# Altium footprint library En.PcbLib: 157 footprints (part 3 of 10)
Each footprint in its own frame and in the unit in brackets; x right, y up, seen from the top. Pads: shape width x height; smd on the part's side, far side on the other; paste and mask are expansions set on the pad; w line width, h text height; cw(c..) or ccw(c..) is an arc to the next point about the centre after c.
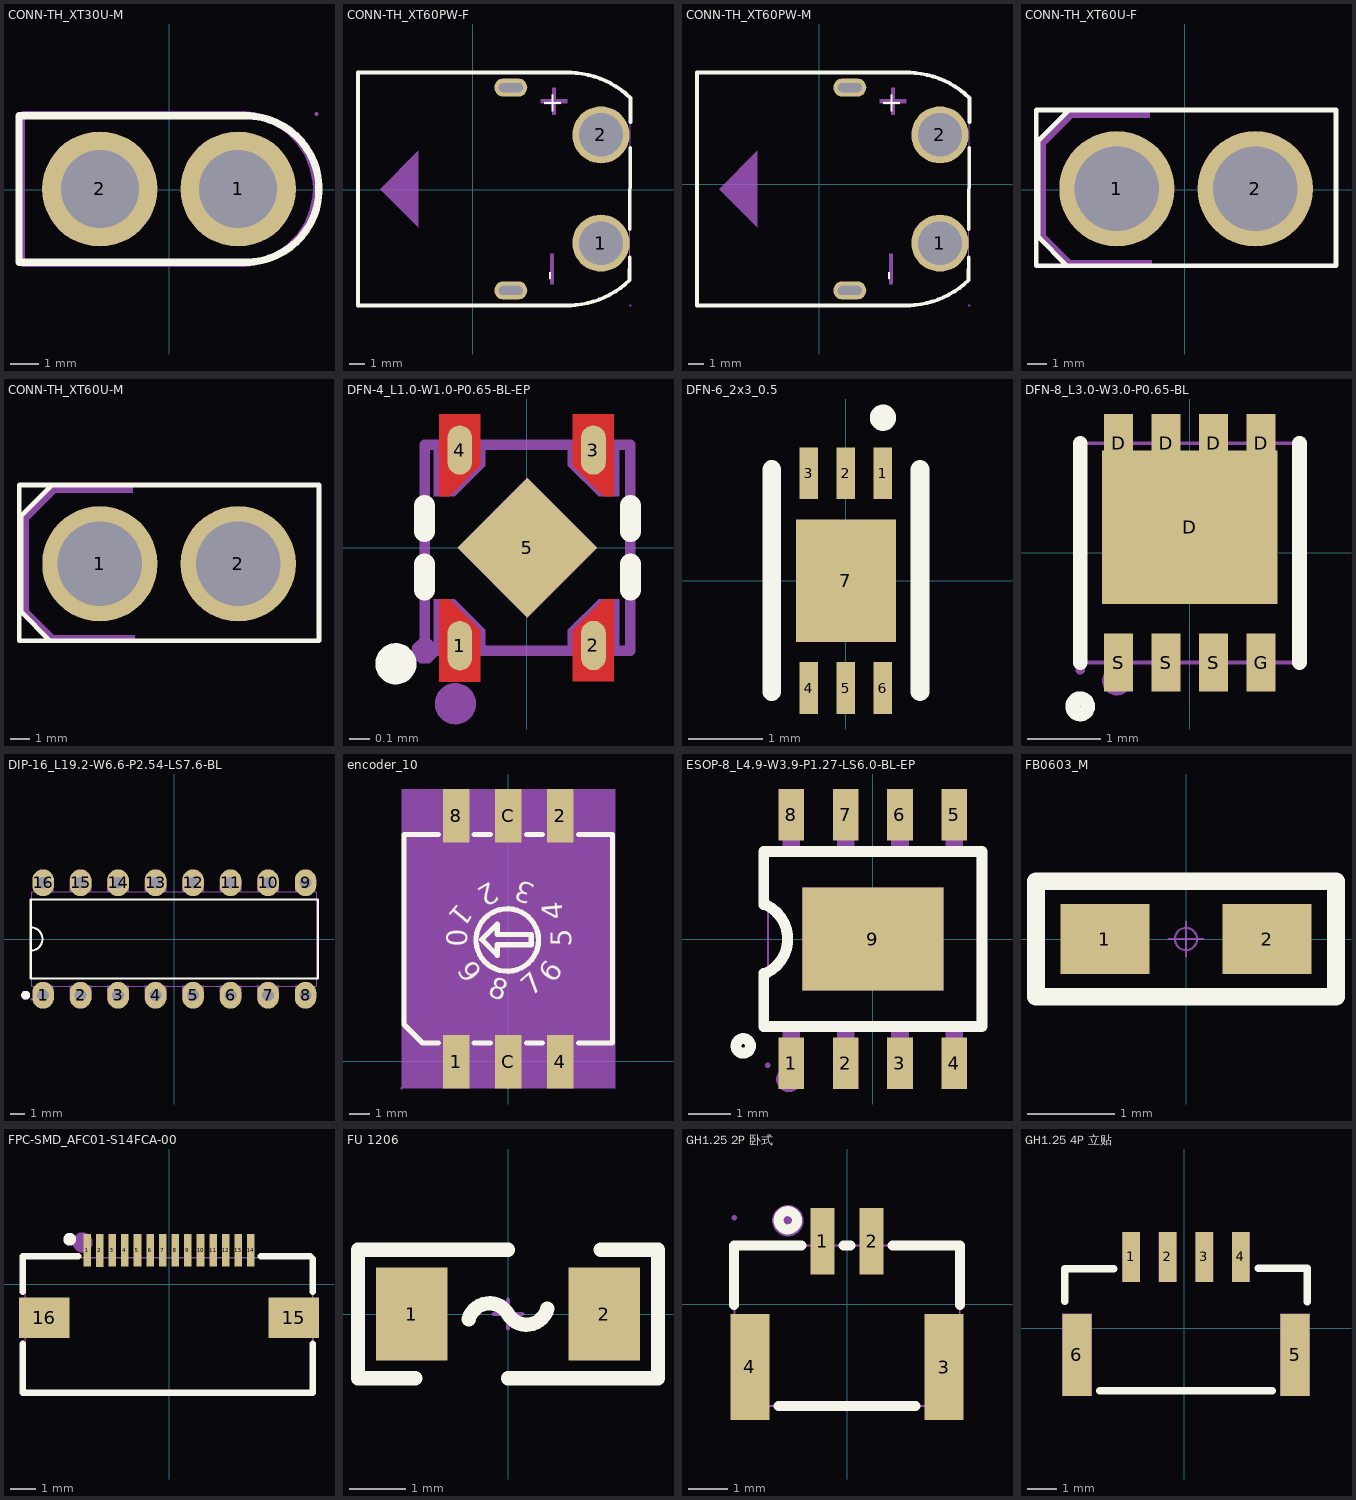
[diagram p2: the footprints below, top view; thin cyan lines are the x and y axes]

## CONN-TH_XT30U-M [mm]
pads (2):
  round 4 hole 2.7: 1(2.4,0.033) 2(-2.4,0.033)
Top Overlay:
  lines w0.254: 2.667,-2.507 ccw(c2.667,0.033) 2.667,2.573 ; 2.794,-2.507 -5.207,-2.507 -5.207,2.573 2.794,2.573
Mechanical 6:
  region: 5,0.033 4.988,0.278 4.892,0.759 4.705,1.212 4.432,1.619 4.086,1.966 3.678,2.238 3.226,2.425 2.745,2.521 2.5,2.533 2.5,2.733 2.677,2.733 3.028,2.687 3.37,2.595 3.697,2.46 4.003,2.283 4.284,2.067 4.534,1.817 4.75,1.536 4.927,1.23 5.062,0.903 5.154,0.561 5.2,0.21 5.2,0.033
  region: 2.5,-2.467 2.745,-2.455 3.226,-2.359 3.678,-2.172 4.086,-1.9 4.432,-1.553 4.705,-1.145 4.892,-0.693 4.988,-0.212 5,0.033 5.2,0.033 5.2,-0.144 5.154,-0.495 5.062,-0.837 4.927,-1.164 4.75,-1.47 4.534,-1.751 4.284,-2.001 4.003,-2.217 3.697,-2.394 3.37,-2.529 3.028,-2.621 2.677,-2.667 2.5,-2.667
  region: 2.5,2.733 -5.1,2.733 -5.2,2.633 -5.2,-2.567 -5.1,-2.667 2.5,-2.667 2.5,-2.467 -5,-2.467 -5,2.533 2.5,2.533
Mechanical 15:
  region: 3.5,0.033 3.5,0.165 3.432,0.419 3.3,0.647 3.114,0.833 2.886,0.965 2.632,1.033 2.368,1.033 2.114,0.965 1.886,0.833 1.7,0.647 1.568,0.419 1.5,0.165 1.5,0.033 1.5,-0.099 1.568,-0.353 1.7,-0.581 1.886,-0.767 2.114,-0.899 2.368,-0.967 2.632,-0.967 2.886,-0.899 3.114,-0.767 3.3,-0.581 3.432,-0.353 3.5,-0.099
  region: -1.5,0.033 -1.5,0.165 -1.568,0.419 -1.7,0.647 -1.886,0.833 -2.114,0.965 -2.368,1.033 -2.632,1.033 -2.886,0.965 -3.114,0.833 -3.3,0.647 -3.432,0.419 -3.5,0.165 -3.5,0.033 -3.5,-0.099 -3.432,-0.353 -3.3,-0.581 -3.114,-0.767 -2.886,-0.899 -2.632,-0.967 -2.368,-0.967 -2.114,-0.899 -1.886,-0.767 -1.7,-0.581 -1.568,-0.353 -1.5,-0.099
  region: 5.174,2.633 5.174,2.658 5.139,2.693 5.089,2.693 5.054,2.658 5.054,2.633 5.054,2.608 5.089,2.573 5.139,2.573 5.174,2.608
  lines w0.051: -5.1,-2.567 2.514,-2.567 ccw(c2.514,0.033) 5.114,0.033 ccw(c2.514,0.033) 2.514,2.633 -5.08,2.573 ccw(c-5.08,2.553) -5.1,2.553 -5.1,-2.567
3D body "User Library-xt30upb-m_XT30UPB-M.sldprt": height 8.8, standoff -0.6, extent -5.12,-2.473 5.08,2.727
3D body "User Library-xt30upb-m_XT30UPB-M-PIN.sldprt": height 7.81, standoff -2.59, extent -3.65,-1.217 -1.15,1.283
3D body "User Library-xt30upb-m_XT30UPB-M-PIN.sldprt": height 7.81, standoff -2.59, extent 1.176,-1.217 3.676,1.283

## CONN-TH_XT60PW-F [mm]
pads (4):
  round 3.8 hole 2.9 paste-2539.97 mask+0.05: 1(8.545,-3.54) 2(8.545,3.66)
  oval 2.2x1.2 hole 0.6 slot 1.6 at 0 deg paste-2539.97 mask+0.05: ""(2.546,-6.69) ""(2.546,6.81)
Top Overlay:
  lines w0.254: 6.434,-7.687 ccw(c6.292,-1.689) 10.462,-6.002 ; 6.482,7.807 cw(c6.34,1.809) 10.51,6.122 10.502,4.501 ; 6.545,-7.69 -7.62,-7.69 -7.62,7.81 6.545,7.81 ; 10.447,-5.934 10.455,-4.484 ; 10.465,-2.616 10.493,2.798
  text "+" at 5.909,5.013 h1.33
  text "-" at 5.655,-6.036 h1.33
Mechanical 6:
  region: 5.165,-4.258 5.419,-4.258 5.419,-6.29 5.165,-6.29
  region: 5.292,6.791 5.546,6.791 5.546,6.029 6.308,6.029 6.308,5.775 5.546,5.775 5.546,5.013 5.292,5.013 5.292,5.775 4.53,5.775 4.53,6.029 5.292,6.029
  region: -3.599,2.6 -3.599,-2.48 -6.139,0.06
Mechanical 15:
  region: 3.146,7.01 3.146,6.61 1.946,6.61 1.946,7.01
  region: 9.546,3.66 9.546,3.792 9.477,4.046 9.346,4.274 9.16,4.46 8.932,4.592 8.677,4.66 8.414,4.66 8.159,4.592 7.931,4.46 7.745,4.274 7.613,4.046 7.545,3.792 7.545,3.66 7.545,3.528 7.613,3.274 7.745,3.046 7.931,2.86 8.159,2.728 8.414,2.66 8.677,2.66 8.932,2.728 9.16,2.86 9.346,3.046 9.477,3.274 9.546,3.528
  region: 9.546,-3.54 9.546,-3.408 9.477,-3.154 9.346,-2.926 9.16,-2.74 8.932,-2.608 8.677,-2.54 8.414,-2.54 8.159,-2.608 7.931,-2.74 7.745,-2.926 7.613,-3.154 7.545,-3.408 7.545,-3.54 7.545,-3.672 7.613,-3.926 7.745,-4.154 7.931,-4.34 8.159,-4.472 8.414,-4.54 8.677,-4.54 8.932,-4.472 9.16,-4.34 9.346,-4.154 9.477,-3.926 9.546,-3.672
  region: 3.146,-6.49 3.146,-6.89 1.946,-6.89 1.946,-6.49
  region: 10.558,-7.687 10.557,-7.663 10.523,-7.63 10.474,-7.63 10.44,-7.663 10.439,-7.687 10.44,-7.711 10.474,-7.745 10.523,-7.745 10.557,-7.711
  lines w0.051: -7.62,-7.687 -7.62,7.807 6.561,7.807 7.323,7.68 8.339,7.426 9.355,6.918 10.371,6.156 10.498,6.029 10.447,-5.934 10.244,-6.163 9.482,-6.798 8.72,-7.179 7.704,-7.433 6.688,-7.687 -7.62,-7.687
3D body "User Library-XT60PW-F.sldprt": height 8.4, standoff -2.5, extent -6.822,-7.69 10.378,7.81

## CONN-TH_XT60PW-M [mm]
pads (4):
  round 3.8 hole 2.9 paste-2539.97 mask+0.05: 1(8.037,-3.921) 2(8.037,3.279)
  oval 2.2x1.2 hole 0.6 slot 1.6 at 0 deg paste-2539.97 mask+0.05: ""(2.038,-7.071) ""(2.038,6.429)
Top Overlay:
  lines w0.254: 5.926,-8.068 ccw(c5.784,-2.07) 9.954,-6.383 ; 5.974,7.426 cw(c5.832,1.428) 10.002,5.741 9.994,4.12 ; 6.037,-8.071 -8.128,-8.071 -8.128,7.429 6.037,7.429 ; 9.939,-6.315 9.947,-4.865 ; 9.957,-2.997 9.985,2.417
  text "-" at 5.147,-6.417 h1.33
  text "+" at 5.401,4.632 h1.33
Mechanical 6:
  region: -4.107,2.219 -4.107,-2.861 -6.647,-0.321
  region: 4.784,6.41 5.038,6.41 5.038,5.648 5.8,5.648 5.8,5.394 5.038,5.394 5.038,4.632 4.784,4.632 4.784,5.394 4.022,5.394 4.022,5.648 4.784,5.648
  region: 4.657,-4.639 4.911,-4.639 4.911,-6.671 4.657,-6.671
Mechanical 15:
  region: 10.05,-8.068 10.049,-8.044 10.015,-8.011 9.966,-8.011 9.932,-8.044 9.931,-8.068 9.932,-8.092 9.966,-8.126 10.015,-8.126 10.049,-8.092
  region: 9.038,3.279 9.038,3.411 8.969,3.665 8.838,3.893 8.652,4.079 8.424,4.211 8.169,4.279 7.906,4.279 7.651,4.211 7.423,4.079 7.237,3.893 7.105,3.665 7.037,3.411 7.037,3.279 7.037,3.147 7.105,2.893 7.237,2.665 7.423,2.479 7.651,2.347 7.906,2.279 8.169,2.279 8.424,2.347 8.652,2.479 8.838,2.665 8.969,2.893 9.038,3.147
  region: 9.038,-3.921 9.038,-3.789 8.969,-3.535 8.838,-3.307 8.652,-3.121 8.424,-2.989 8.169,-2.921 7.906,-2.921 7.651,-2.989 7.423,-3.121 7.237,-3.307 7.105,-3.535 7.037,-3.789 7.037,-3.921 7.037,-4.053 7.105,-4.307 7.237,-4.535 7.423,-4.721 7.651,-4.853 7.906,-4.921 8.169,-4.921 8.424,-4.853 8.652,-4.721 8.838,-4.535 8.969,-4.307 9.038,-4.053
  region: 2.638,6.629 2.638,6.229 1.438,6.229 1.438,6.629
  region: 2.638,-6.871 2.638,-7.271 1.438,-7.271 1.438,-6.871
  lines w0.051: -8.128,-8.068 6.18,-8.068 7.196,-7.814 8.212,-7.56 8.974,-7.179 9.736,-6.544 9.939,-6.315 9.99,5.648 9.863,5.775 8.847,6.537 7.831,7.045 6.815,7.299 6.053,7.426 -8.128,7.426 -8.128,-8.068
3D body "User Library-XT60IPW-M--3DModel-STEP-56544.sldprt": height 8.04, standoff -2.91, extent -8.329,-8.004 9.271,7.496

## CONN-TH_XT60U-F [mm]
pads (2):
  round 6 hole 4.4 paste-2539.97 mask+0.05: 1(-3.537,0.046) 2(3.663,0.046)
Top Overlay:
  lines w0.254: -5.936,-3.954 -7.737,-3.954 -7.737,4.146 -6.038,4.146 ; -5.238,4.146 7.863,4.146 7.863,-3.955 -6.137,-3.955 -7.636,-2.453 -7.636,2.545 -6.038,4.146 ; -5.136,4.146 -6.038,4.146
Mechanical 6:
  region: -1.837,4.146 -6.037,4.146 -7.637,2.546 -7.637,-2.454 -6.137,-3.954 -1.737,-3.954 -1.737,-3.654 -5.937,-3.654 -7.237,-2.354 -7.237,2.346 -5.837,3.746 -1.837,3.746
Mechanical 15:
  region: -7.627,-4.004 -7.627,-3.979 -7.662,-3.944 -7.712,-3.944 -7.747,-3.979 -7.747,-4.004 -7.747,-4.029 -7.712,-4.064 -7.662,-4.064 -7.627,-4.029
  region: -1.787,0.046 -1.787,0.218 -1.854,0.556 -1.986,0.875 -2.178,1.162 -2.421,1.405 -2.708,1.597 -3.026,1.729 -3.365,1.796 -3.709,1.796 -4.047,1.729 -4.366,1.597 -4.653,1.405 -4.896,1.162 -5.088,0.875 -5.22,0.556 -5.287,0.218 -5.287,0.046 -5.287,-0.126 -5.22,-0.464 -5.088,-0.783 -4.896,-1.07 -4.653,-1.313 -4.366,-1.505 -4.047,-1.637 -3.709,-1.704 -3.365,-1.704 -3.026,-1.637 -2.708,-1.505 -2.421,-1.313 -2.178,-1.07 -1.986,-0.783 -1.854,-0.464 -1.787,-0.126
  region: 5.413,0.046 5.413,0.218 5.346,0.556 5.214,0.875 5.022,1.162 4.779,1.405 4.492,1.597 4.173,1.729 3.835,1.796 3.491,1.796 3.152,1.729 2.834,1.597 2.547,1.405 2.304,1.162 2.112,0.875 1.98,0.556 1.913,0.218 1.913,0.046 1.913,-0.126 1.98,-0.464 2.112,-0.783 2.304,-1.07 2.547,-1.313 2.834,-1.505 3.152,-1.637 3.491,-1.704 3.835,-1.704 4.173,-1.637 4.492,-1.505 4.779,-1.313 5.022,-1.07 5.214,-0.783 5.346,-0.464 5.413,-0.126
  lines w0.051: -7.687,-4.004 -7.687,4.096 7.813,4.096 7.813,-4.004 -7.687,-4.004
3D body "User Library-XT60.sldprt": height 5.38, standoff -16.62, extent -7.967,-3.937 7.967,4.191

## CONN-TH_XT60U-M [mm]
pads (2):
  round 6 hole 4.4 paste-2539.97 mask+0.05: 1(39.897,-29.037) 2(47.097,-29.037)
Top Overlay:
  lines w0.254: 37.498,-33.037 35.697,-33.037 35.697,-24.937 37.396,-24.937 ; 38.196,-24.937 51.297,-24.937 51.297,-33.038 37.297,-33.038 35.798,-31.536 35.798,-26.538 37.396,-24.937 ; 38.298,-24.937 37.396,-24.937
Mechanical 6:
  region: 41.597,-24.937 37.397,-24.937 35.797,-26.537 35.797,-31.537 37.297,-33.037 41.697,-33.037 41.697,-32.737 37.497,-32.737 36.197,-31.437 36.197,-26.737 37.597,-25.337 41.597,-25.337
Mechanical 15:
  region: 35.807,-33.087 35.807,-33.062 35.772,-33.027 35.722,-33.027 35.687,-33.062 35.687,-33.087 35.687,-33.112 35.722,-33.147 35.772,-33.147 35.807,-33.112
  region: 41.647,-29.037 41.647,-28.865 41.58,-28.527 41.448,-28.208 41.256,-27.921 41.013,-27.678 40.726,-27.486 40.408,-27.354 40.069,-27.287 39.725,-27.287 39.387,-27.354 39.068,-27.486 38.781,-27.678 38.538,-27.921 38.346,-28.208 38.214,-28.527 38.147,-28.865 38.147,-29.037 38.147,-29.209 38.214,-29.547 38.346,-29.866 38.538,-30.153 38.781,-30.396 39.068,-30.588 39.387,-30.72 39.725,-30.787 40.069,-30.787 40.408,-30.72 40.726,-30.588 41.013,-30.396 41.256,-30.153 41.448,-29.866 41.58,-29.547 41.647,-29.209
  region: 48.847,-29.037 48.847,-28.865 48.78,-28.527 48.648,-28.208 48.456,-27.921 48.213,-27.678 47.926,-27.486 47.607,-27.354 47.269,-27.287 46.925,-27.287 46.586,-27.354 46.268,-27.486 45.981,-27.678 45.738,-27.921 45.546,-28.208 45.414,-28.527 45.347,-28.865 45.347,-29.037 45.347,-29.209 45.414,-29.547 45.546,-29.866 45.738,-30.153 45.981,-30.396 46.268,-30.588 46.586,-30.72 46.925,-30.787 47.269,-30.787 47.607,-30.72 47.926,-30.588 48.213,-30.396 48.456,-30.153 48.648,-29.866 48.78,-29.547 48.847,-29.209
  lines w0.051: 35.747,-33.087 35.747,-24.987 51.247,-24.987 51.247,-33.087 35.747,-33.087
3D body "User Library-XT60UPB Fem Vert_60UPB-MTJ.sldprt": height 8.38, standoff -6.02, extent 37.747,-31.187 42.047,-26.887
3D body "User Library-XT60UPB Fem Vert_60UPB-MTJ.sldprt": height 8.38, standoff -6.02, extent 44.986,-31.187 49.286,-26.887
3D body "User Library-XT60UPB Fem Vert_XT60UPB-ME毈_-UL.sldprt": height 13.5, standoff 0, extent 35.89,-33.02 51.232,-25.12

## DFN-4_L1.0-W1.0-P0.65-BL-EP [mm]
pads (5):
  oval 0.12x0.24 smd: 1(-0.325,-0.475) 2(0.325,-0.474) 3(0.325,0.475) 4(-0.325,0.475)
  rect 0.48x0.48 smd rot 45: 5(0.004,0.001)
Top Layer:
  region: 0.425,0.651 0.425,0.251 0.375,0.251 0.225,0.401 0.225,0.651
  region: -0.425,0.651 -0.225,0.651 -0.225,0.401 -0.375,0.251 -0.425,0.251
  region: -0.225,-0.4 -0.225,-0.65 -0.425,-0.65 -0.425,-0.25 -0.375,-0.25
  region: 0.425,-0.649 0.225,-0.649 0.225,-0.399 0.375,-0.249 0.425,-0.249
Top Overlay:
  circle w0.1: c-0.635,-0.563 r0.05
  lines w0.102: -0.496,-0.205 -0.496,-0.078 ; -0.496,0.079 -0.496,0.206 ; 0.504,-0.205 0.504,-0.078 ; 0.504,0.079 0.504,0.206
Mechanical 6:
  circle w0.1: c-0.346,-0.757 r0.05
Mechanical 15:
  region: -0.335,0.001 0.004,0.34 0.344,0.001 0.004,-0.339
  region: -0.45,0.501 -0.2,0.501 -0.2,0.4 -0.35,0.25 -0.45,0.25
  region: 0.45,0.501 0.2,0.501 0.2,0.4 0.35,0.25 0.45,0.25
  region: -0.45,-0.499 -0.2,-0.499 -0.2,-0.399 -0.35,-0.249 -0.45,-0.249
  region: 0.45,-0.499 0.2,-0.499 0.2,-0.399 0.35,-0.249 0.45,-0.249
  region: -0.435,-0.501 -0.436,-0.477 -0.471,-0.442 -0.52,-0.442 -0.555,-0.477 -0.555,-0.501 -0.555,-0.526 -0.52,-0.56 -0.471,-0.56 -0.436,-0.526
  lines w0.051: -0.495,-0.499 -0.495,0.501 0.505,0.501 0.505,-0.499 -0.495,-0.499
3D body "sk6018cd4-33.step": height 0.51, standoff 0, extent -0.51,-0.51 0.51,0.51

## DFN-6_2x3_0.5 [mm]
pads (7):
  rect 0.25x0.7 smd: 1(0.498,1.45) 2(0,1.45) 3(-0.5,1.45) 4(-0.5,-1.45) 5(-0.001,-1.45) 6(0.5,-1.45)
  rect 1.35x1.65 smd: 7(0,0)
Top Overlay:
  circle w0.254: c0.5,2.2 r0.05
  lines w0.254: -1,-1.5 -1,1.5 ; 1,-1.5 1,1.5
Mechanical 4:
  circle w0.06: c1,1.5 r0.03
3D body "User Library-DFN-6.STEP": height 0.8, standoff 0, extent -1,-1.5 1,1.5

## DFN-8_L3.0-W3.0-P0.65-BL [mm]
pads (9):
  rect 0.4x0.8 smd paste-100 mask+0.051: D(-0.975,1.5) D(-0.325,1.5) D(0.325,1.5) D(0.975,1.5) G(0.975,-1.5) S(-0.975,-1.5) S(-0.325,-1.5) S(0.325,-1.5)
  rect 2.4x2.1 smd paste-100 mask+0.051: D(0,0.35)
Top Overlay:
  circle w0.2: c-1.5,-2.1 r0.105
  lines w0.2: -1.5,-1.5 -1.5,1.5 ; 1.5,-1.5 1.5,1.5
Top Paste:
  region: -0.775,-1.9 -1.175,-1.9 -1.175,-1.1 -0.775,-1.1
  region: -0.125,-1.9 -0.525,-1.9 -0.525,-1.1 -0.125,-1.1
  region: 0.525,-1.9 0.125,-1.9 0.125,-1.1 0.525,-1.1
  region: 1.175,-1.9 0.775,-1.9 0.775,-1.1 1.175,-1.1
  region: 1.2,-0.7 -1.2,-0.7 -1.2,1.4 -1.175,1.4 -1.175,1.9 -0.775,1.9 -0.775,1.4 -0.525,1.4 -0.525,1.9 -0.125,1.9 -0.125,1.4 0.125,1.4 0.125,1.9 0.525,1.9 0.525,1.4 0.775,1.4 0.775,1.9 1.175,1.9 1.175,1.4 1.2,1.4
Mechanical 6:
  circle w0.2: c-1,-1.75 r0.1
Mechanical 15:
  region: -1.44,-1.6 -1.44,-1.576 -1.475,-1.541 -1.524,-1.541 -1.559,-1.576 -1.56,-1.6 -1.559,-1.625 -1.524,-1.659 -1.475,-1.659 -1.44,-1.625
  region: 1.125,1.2 0.825,1.2 0.825,1.6 1.125,1.6
  region: 1.125,-1.6 0.825,-1.6 0.825,-1.2 1.125,-1.2
  region: -1.175,1.35 1.175,1.35 1.175,-0.65 -1.175,-0.65
  region: 0.475,-1.6 0.175,-1.6 0.175,-1.2 0.475,-1.2
  region: -0.175,-1.6 -0.475,-1.6 -0.475,-1.2 -0.175,-1.2
  region: -0.825,-1.6 -1.125,-1.6 -1.125,-1.2 -0.825,-1.2
  region: 0.475,1.2 0.175,1.2 0.175,1.6 0.475,1.6
  region: -0.175,1.2 -0.475,1.2 -0.475,1.6 -0.175,1.6
  region: -0.825,1.2 -1.125,1.2 -1.125,1.6 -0.825,1.6
  lines w0.051: -1.5,-1.5 -1.5,1.5 1.5,1.5 1.5,-1.5 -1.5,-1.5
3D body "User Library-DFN_3x3_8L_EP2_P_body.sldprt": height 0.8, standoff 0, extent -1.5,-1.5 1.5,1.5
3D body "User Library-DFN_3x3_8L_EP2_P_lead frame.sldprt": height 0.15, standoff 0, extent -1.55,-1.6 1.55,1.6

## DIP-16_L19.2-W6.6-P2.54-LS7.6-BL [mm]
pads (16):
  oval 1.46x1.825 hole 0.8: 1(-8.89,-3.81) 2(-6.35,-3.81) 3(-3.81,-3.81) 4(-1.27,-3.81) 5(1.27,-3.81) 6(3.81,-3.81) 7(6.35,-3.81) 8(8.89,-3.81) 9(8.89,3.81) 10(6.35,3.81) 11(3.81,3.81) 12(1.27,3.81) 13(-1.27,3.81) 14(-3.81,3.81) 15(-6.35,3.81) 16(-8.89,3.81)
Top Overlay:
  circle w0.3: c-10.072,-3.81 r0.15
  lines w0.152: -9.729,-0.794 ccw(c-9.729,0) -9.729,0.794 ; -9.729,-2.669 -9.729,2.669 9.729,2.669 9.729,-2.669 -9.729,-2.669
Mechanical 6:
  circle w0.3: c-10.072,-3.81 r0.15
Mechanical 15:
  drawing of 37 lines, arcs and shapes, not listed
3D body "xd74ls147.step": height 3.31, standoff -4.05, extent -9.6,-3.833 9.6,4.087

## encoder_10 [mm]
pads (6):
  rect 1.3x2.6 smd: 1(-2.54,-0.025) 2(2.54,11.975) 4(2.54,-0.025) 8(-2.54,11.975) C(0,-0.025) C(0,11.975)
Top Overlay:
  circle w0.254: c-0.05,5.909 r1.524
  lines w0.254: -3.421,0.895 -4.191,0.895 -5.08,1.784 -5.08,11.055 -3.421,11.055 ; -1.659,0.895 -0.881,0.895 ; -1.659,11.055 -0.881,11.055 ; 0.881,0.895 1.659,0.895 ; 0.881,11.055 1.659,11.055 ; 3.421,0.895 5.08,0.895 5.08,11.055 3.421,11.055 ; -1.299,5.931 -0.537,6.693 -0.537,6.185 1.114,6.185 1.114,5.677 -0.537,5.677 -0.537,5.296 -0.537,5.169 -1.299,5.931
  text "7" at 1.133,3.118 h1
  text "6" at 2.207,3.75 h1
  text "5" at 3.072,5.576 h1
  text "3" at 1.365,8.558 h1
  text "2" at -0.865,8.786 h1
  text "1" at -2.418,7.761 h1
  text "9" at -2.545,4.438 h1
  text "8" at -1.044,3.21 h1
  text "4" at 2.674,6.955 h1
  text "0" at -2.008,5.576 h1
Mechanical 4:
  region: -5.207,13.275 5.207,13.275 5.207,-1.325 -5.207,-1.325
Mechanical 5:
  region: -3.19,-1.325 -3.19,1.275 -1.89,1.275 -1.89,-1.325
  region: -0.65,-1.325 -0.65,1.275 0.65,1.275 0.65,-1.325
  region: 1.89,-1.325 1.89,1.275 3.19,1.275 3.19,-1.325
  region: 1.89,10.675 1.89,13.275 3.19,13.275 3.19,10.675
  region: -0.65,10.675 -0.65,13.275 0.65,13.275 0.65,10.675
  region: -3.19,10.675 -3.19,13.275 -1.89,13.275 -1.89,10.675
Mechanical 6:
  circle w0.06: c-5.207,-1.325 r0.03
Mechanical 15:
  lines w0.003: -0.04,6.38 0.01,6.431

## ESOP-8_L4.9-W3.9-P1.27-LS6.0-BL-EP [mm]
pads (9):
  rect 0.6x1.2 smd: 1(-1.905,-2.908) 2(-0.635,-2.908) 3(0.635,-2.908) 4(1.905,-2.908) 5(1.905,2.908) 6(0.635,2.908) 7(-0.635,2.908) 8(-1.905,2.908)
  rect 3.3x2.4 smd: 9(0,0)
Top Overlay:
  circle w0.254: c-3.03,-2.5 r0.17
  lines w0.254: -2.55,-0.8 -2.55,-2.05 2.55,-2.05 2.55,2.05 -2.55,2.05 -2.55,0.8 ; -2.5,-0.8 ccw(c-2.875,0) -2.5,0.8
Mechanical 6:
  circle w0.3: c-1.96,-3.28 r0.15
Mechanical 15:
  region: -2.394,-2.95 -2.395,-2.925 -2.43,-2.891 -2.479,-2.891 -2.514,-2.926 -2.514,-2.95 -2.514,-2.974 -2.479,-3.009 -2.43,-3.009 -2.395,-2.974
  region: -2.105,1.94 -2.105,2.31 -1.705,2.31 -1.705,1.94
  region: -2.105,2.3 -2.105,2.95 -1.705,2.95 -1.705,2.3
  region: -0.835,1.94 -0.835,2.31 -0.435,2.31 -0.435,1.94
  region: -0.835,2.3 -0.835,2.95 -0.435,2.95 -0.435,2.3
  region: 0.435,1.94 0.435,2.31 0.835,2.31 0.835,1.94
  region: 0.435,2.3 0.435,2.95 0.835,2.95 0.835,2.3
  region: 1.705,1.94 1.705,2.31 2.105,2.31 2.105,1.94
  region: 1.705,2.3 1.705,2.95 2.105,2.95 2.105,2.3
  region: -2.105,-2.31 -2.105,-1.94 -1.705,-1.94 -1.705,-2.31
  region: -2.105,-2.95 -2.105,-2.3 -1.705,-2.3 -1.705,-2.95
  region: -0.835,-2.31 -0.835,-1.94 -0.435,-1.94 -0.435,-2.31
  region: -0.835,-2.95 -0.835,-2.3 -0.435,-2.3 -0.435,-2.95
  region: 0.435,-2.31 0.435,-1.94 0.835,-1.94 0.835,-2.31
  region: 0.435,-2.95 0.435,-2.3 0.835,-2.3 0.835,-2.95
  region: 1.705,-2.31 1.705,-1.94 2.105,-1.94 2.105,-2.31
  region: 1.705,-2.95 1.705,-2.3 2.105,-2.3 2.105,-2.95
  region: 1.65,-1.2 -1.65,-1.2 -1.65,1.2 1.65,1.2
  lines w0.051: -2.45,-1.95 2.45,-1.95 2.45,1.95 -2.45,1.95 -2.45,-1.95
3D body "ESOP8.STEP": height 1.53, standoff -0.01, extent -2.5,-3.003 2.5,3.003

## FB0603_M [mil] "0603贴片磁珠"
pads (2):
  rect 40x31.5 smd: 1(-36.5,0) 2(36.5,0)
Top Overlay:
  lines w8: -67.5,-26 -67.5,26 67.5,26 67.5,-26 -67.5,-26
Mechanical 15:
  circle w1: c0,0 r5
  lines w1: -7.87,0 7.87,0 ; 0,-7.87 0,7.87
3D body "742792602.stp": height 31.5, standoff 0, extent -31.5,-15.75 31.5,15.75

## FPC-SMD_AFC01-S14FCA-00 [mm]
pads (16):
  rect 0.3x1.3 smd: 1(-3.25,1.34) 2(-2.75,1.339) 3(-2.25,1.34) 4(-1.75,1.34) 5(-1.25,1.34) 6(-0.75,1.34) 7(-0.25,1.34) 8(0.25,1.34) 9(0.75,1.34) 10(1.25,1.34) 11(1.75,1.34) 12(2.25,1.34) 13(2.75,1.34) 14(3.25,1.34)
  rect 2x1.6 smd: 15(4.948,-1.34) 16(-4.948,-1.34)
Top Overlay:
  circle w0.254: c-3.937,1.778 r0.127
  lines w0.254: -5.8,-2.371 -5.8,-4.3 5.7,-4.3 5.7,-2.371 ; -5.8,-0.309 -5.8,1.1 -3.6,1.1 ; 3.631,1.1 5.6,1.1 5.7,1 5.7,-0.309
Mechanical 6:
  circle w0.4: c-3.429,1.651 r0.2
Mechanical 15:
  region: 3.15,0.95 3.35,0.95 3.35,1.73 3.15,1.73
  region: 2.65,0.95 2.85,0.95 2.85,1.73 2.65,1.73
  region: 2.15,0.95 2.35,0.95 2.35,1.73 2.15,1.73
  region: 1.65,0.95 1.85,0.95 1.85,1.73 1.65,1.73
  region: 1.15,0.95 1.35,0.95 1.35,1.73 1.15,1.73
  region: 0.65,0.95 0.85,0.95 0.85,1.73 0.65,1.73
  region: 0.15,0.95 0.35,0.95 0.35,1.73 0.15,1.73
  region: -0.35,0.95 -0.15,0.95 -0.15,1.73 -0.35,1.73
  region: -0.85,0.95 -0.65,0.95 -0.65,1.73 -0.85,1.73
  region: -1.35,0.95 -1.15,0.95 -1.15,1.73 -1.35,1.73
  region: -1.85,0.95 -1.65,0.95 -1.65,1.73 -1.85,1.73
  region: -2.35,0.95 -2.15,0.95 -2.15,1.73 -2.35,1.73
  region: -2.85,0.948 -2.65,0.948 -2.65,1.728 -2.85,1.728
  region: -3.35,0.95 -3.15,0.95 -3.15,1.73 -3.35,1.73
  region: 4.196,-0.84 4.196,-1.84 5.696,-1.84 5.696,-0.84
  region: -5.7,-0.84 -5.7,-1.84 -4.2,-1.84 -4.2,-0.84
  region: -5.64,-4.301 -5.641,-4.277 -5.676,-4.242 -5.724,-4.242 -5.759,-4.277 -5.76,-4.301 -5.759,-4.325 -5.724,-4.36 -5.676,-4.36 -5.641,-4.325
  lines w0.051: -5.702,-4.301 5.698,-4.301 5.698,1.049 -5.702,1.049 -5.702,-4.301
3D body "User Library-FPC0_5MM2_0H14P.SLDPRT": height 1.71, standoff -0.39, extent -5.578,-4.49 5.522,1.91

## FU 1206 [mil] "贴片保险丝"
pads (2):
  rect 50x65 smd: 1(-67.5,0) 2(67.5,0)
Top Overlay:
  lines w10: -90,45 0,45 ; -65,-45 -105,-45 -105,45 -65,45 ; -27.48,-3.62 cw(c-12.99,-7.5) 0,0 ccw(c12.99,7.5) 27.48,3.62 ; 0,-45 90,-45 ; 65,-45 105,-45 105,45 65,45
Mechanical 15:
  lines w3: -10,0 10,0 ; 0,-10 0,10
3D body "FU 01206.STEP": height 34.25, standoff 0, extent -62.99,-31.89 62.99,31.89

## GH1.25 2P 卧式 [mm]
pads (4):
  rect 0.6x1.7 smd mask+0.051: 1(-0.625,1.602) 2(0.625,1.602)
  rect 1x2.7 smd mask+0.051: 3(2.475,-1.602) 4(-2.475,-1.598)
Top Overlay:
  circle w0.254: c-1.51,2.14 r0.233
  lines w0.254: -2.88,-0.017 -2.88,1.5 -1.156,1.5 ; -1.744,-2.6 1.744,-2.6 ; -0.094,1.5 0.094,1.5 ; 1.156,1.5 2.88,1.5 2.88,-0.021
Mechanical 6:
  circle w0.4: c-1.51,2.13 r0.2
Mechanical 15:
  region: -2.815,2.202 -2.815,2.227 -2.85,2.262 -2.9,2.262 -2.935,2.227 -2.935,2.202 -2.935,2.177 -2.9,2.142 -2.85,2.142 -2.815,2.177 -2.815,2.202
  region: 0.525,2.202 0.725,2.202 0.725,1.002 0.525,1.002
  region: -0.725,2.202 -0.525,2.202 -0.525,1.002 -0.725,1.002
  region: 2.375,-0.602 2.575,-0.602 2.575,-2.602 2.375,-2.602
  region: -2.575,-0.598 -2.375,-0.598 -2.375,-2.598 -2.575,-2.598
  lines w0.051: -2.875,-2.598 -2.875,1.502 2.875,1.502 2.875,-2.598 -2.875,-2.598
3D body "User Library-GH-2-90.STEP": height 4.13, standoff -0.02, extent -2.88,-2.506 2.88,2.046

## GH1.25 4P 立贴 [mm]
pads (6):
  rect 0.6x1.7 smd: 1(-1.809,2.44) 2(-0.559,2.44) 3(0.691,2.44) 4(1.941,2.44)
  rect 1x2.8 smd: 5(3.791,-0.91) 6(-3.659,-0.91)
Top Overlay:
  lines w0.254: -4.084,0.92 -4.084,2.04 -2.404,2.04 ; -2.884,-2.13 3.016,-2.13 ; 2.535,2.054 4.217,2.054 ; 4.216,0.9 4.216,2.04
Mechanical 5:
  region: 1.641,3.29 2.241,3.29 2.241,1.59 1.641,1.59
  region: -0.859,3.29 -0.259,3.29 -0.259,1.59 -0.859,1.59
  region: -2.109,3.29 -1.509,3.29 -1.509,1.59 -2.109,1.59
  region: 3.291,0.49 4.291,0.49 4.291,-2.31 3.291,-2.31
  region: -4.159,0.49 -3.159,0.49 -3.159,-2.31 -4.159,-2.31
  region: 0.391,3.29 0.991,3.29 0.991,1.59 0.391,1.59
3D body "User Library-GH-4-180.sldprt": height 4.22, standoff 0.02, extent -4.13,-2.157 4.13,2.793